# Altium schematic symbol library jlcpcb_2025_04_capacitors_extended_0603.schlib: 3668 symbols (part 5 of 20) (continued)
## 0603ZC104KAT2A
designator C?  Capacitance: 100nF  (hidden comment: *)
Capacitor, Ceramic (MLCC), 100nF, ±10%, 10V, X7R, ±10%, SMD 0603; Manufacturer: AVX; Manufacturer Part Number: 0603ZC104KAT2A; Package Size: 0603; JLCPCB Basic Part: No; JLCPCB Part Number: C597251; Supplier 1: LCSC; Category: Capacitors - MLCC; Supplier Part Number 1: C597251; Tolerance: ±10%; Voltage Rating: 10V; Temperature Coefficient: X7R; RoHS: Yes; ComponentLink1Description: Datasheet; ComponentLink1URL: https://wmsc.lcsc.com/wmsc/upload/file/pdf/v2/lcsc/2304140030_Kyocera-AVX-0603ZC104KAT2A_C597251.pdf; ComponentLink2Description: JLCPCB Part URL; ComponentLink2URL: https://jlcpcb.com/partdetail/C597251; ComponentLink3Description: LCSC Part URL; ComponentLink3URL: https://lcsc.com/product-detail/Multilayer-Ceramic-Capacitors-MLCC---SMD-SMT_Kyocera-AVX-Kyocera-AVX-0603ZC104KAT2A_C597251.html
footprint CAP-0603 (0603 (1608M) Capacitor)
pins: 1, 2

## 0603ZC105KAT2A
designator C?  Capacitance: 1uF  (hidden comment: *)
Capacitor, Ceramic (MLCC), 1uF, ±10%, 10V, X7R, ±10%, SMD 0603; Manufacturer: AVX; Manufacturer Part Number: 0603ZC105KAT2A; Package Size: 0603; JLCPCB Basic Part: No; JLCPCB Part Number: C597252; Supplier 1: LCSC; Category: Capacitors - MLCC; Supplier Part Number 1: C597252; Tolerance: ±10%; Voltage Rating: 10V; Temperature Coefficient: X7R; RoHS: Yes; ComponentLink1Description: Datasheet; ComponentLink1URL: https://wmsc.lcsc.com/wmsc/upload/file/pdf/v2/lcsc/2304140030_Kyocera-AVX-0603ZC105KAT2A_C597252.pdf; ComponentLink2Description: JLCPCB Part URL; ComponentLink2URL: https://jlcpcb.com/partdetail/C597252; ComponentLink3Description: LCSC Part URL; ComponentLink3URL: https://lcsc.com/product-detail/Multilayer-Ceramic-Capacitors-MLCC---SMD-SMT_Kyocera-AVX-Kyocera-AVX-0603ZC105KAT2A_C597252.html
footprint CAP-0603 (0603 (1608M) Capacitor)
pins: 1, 2

## 0603ZD104KAT2A
designator C?  Capacitance: 100nF  (hidden comment: *)
Capacitor, Ceramic (MLCC), 100nF, ±10%, 10V, X5R, ±10%, SMD 0603; Manufacturer: Kyocera AVX; Manufacturer Part Number: 0603ZD104KAT2A; Package Size: 0603; JLCPCB Basic Part: No; JLCPCB Part Number: C1856507; Supplier 1: LCSC; Category: Capacitors - MLCC; Supplier Part Number 1: C1856507; Tolerance: ±10%; Voltage Rating: 10V; Temperature Coefficient: X5R; RoHS: Yes; ComponentLink1Description: Datasheet; ComponentLink1URL: https://wmsc.lcsc.com/wmsc/upload/file/pdf/v2/lcsc/2304140030_Kyocera-AVX-0603ZD104KAT2A_C1856507.pdf; ComponentLink2Description: JLCPCB Part URL; ComponentLink2URL: https://jlcpcb.com/partdetail/C1856507; ComponentLink3Description: LCSC Part URL; ComponentLink3URL: https://lcsc.com/product-detail/Multilayer-Ceramic-Capacitors-MLCC---SMD-SMT_Kyocera-AVX-Kyocera-AVX-0603ZD104KAT2A_C1856507.html
footprint CAP-0603 (0603 (1608M) Capacitor)
pins: 1, 2

## 0603ZD105MAT2A
designator C?  Capacitance: 1uF  (hidden comment: *)
Capacitor, Ceramic (MLCC), 1uF, ±20%, 10V, X5R, ±20%, SMD 0603; Manufacturer: Kyocera AVX; Manufacturer Part Number: 0603ZD105MAT2A; Package Size: 0603; JLCPCB Basic Part: No; JLCPCB Part Number: C2173287; Supplier 1: LCSC; Category: Capacitors - MLCC; Supplier Part Number 1: C2173287; Tolerance: ±20%; Voltage Rating: 10V; Temperature Coefficient: X5R; RoHS: Yes; ComponentLink1Description: Datasheet; ComponentLink1URL: https://wmsc.lcsc.com/wmsc/upload/file/pdf/v2/lcsc/2304140030_Kyocera-AVX-0603ZD105MAT2A_C2173287.pdf; ComponentLink2Description: JLCPCB Part URL; ComponentLink2URL: https://jlcpcb.com/partdetail/C2173287; ComponentLink3Description: LCSC Part URL; ComponentLink3URL: https://lcsc.com/product-detail/Multilayer-Ceramic-Capacitors-MLCC---SMD-SMT_Kyocera-AVX-Kyocera-AVX-0603ZD105MAT2A_C2173287.html
footprint CAP-0603 (0603 (1608M) Capacitor)
pins: 1, 2

## 0603ZD475KAT2A
designator C?  Capacitance: 4.7uF  (hidden comment: *)
Capacitor, Ceramic (MLCC), 4.7uF, ±10%, 10V, X5R, ±10%, SMD 0603; Manufacturer: Kyocera AVX; Manufacturer Part Number: 0603ZD475KAT2A; Package Size: 0603; JLCPCB Basic Part: No; JLCPCB Part Number: C143643; Supplier 1: LCSC; Category: Capacitors - MLCC; Supplier Part Number 1: C143643; Tolerance: ±10%; Voltage Rating: 10V; Temperature Coefficient: X5R; RoHS: Yes; ComponentLink1Description: Datasheet; ComponentLink1URL: https://wmsc.lcsc.com/wmsc/upload/file/pdf/v2/lcsc/2212141909_Kyocera-AVX-0603ZD475KAT2A_C143643.pdf; ComponentLink2Description: JLCPCB Part URL; ComponentLink2URL: https://jlcpcb.com/partdetail/C143643; ComponentLink3Description: LCSC Part URL; ComponentLink3URL: https://lcsc.com/product-detail/Multilayer-Ceramic-Capacitors-MLCC---SMD-SMT_Kyocera-AVX-Kyocera-AVX-0603ZD475KAT2A_C143643.html
footprint CAP-0603 (0603 (1608M) Capacitor)
pins: 1, 2

## 0603ZG105ZAT2A
designator C?  Capacitance: 1uF  (hidden comment: *)
Capacitor, Ceramic (MLCC), 1uF, 10V, Y5V, SMD 0603; Manufacturer: AVX; Manufacturer Part Number: 0603ZG105ZAT2A; Temperature Rating: -20%~+80%; Package Size: 0603; JLCPCB Basic Part: No; JLCPCB Part Number: C597257; Supplier 1: LCSC; Category: Capacitors - MLCC; Supplier Part Number 1: C597257; Voltage Rating: 10V; Temperature Coefficient: Y5V; RoHS: Yes; ComponentLink1Description: Datasheet; ComponentLink1URL: https://wmsc.lcsc.com/wmsc/upload/file/pdf/v2/lcsc/2304140030_Kyocera-AVX-0603ZG105ZAT2A_C597257.pdf; ComponentLink2Description: JLCPCB Part URL; ComponentLink2URL: https://jlcpcb.com/partdetail/C597257; ComponentLink3Description: LCSC Part URL; ComponentLink3URL: https://lcsc.com/product-detail/Multilayer-Ceramic-Capacitors-MLCC---SMD-SMT_Kyocera-AVX-Kyocera-AVX-0603ZG105ZAT2A_C597257.html
footprint CAP-0603 (0603 (1608M) Capacitor)
pins: 1, 2

## 06031A100JAT2A
designator C?  Capacitance: 10pF  (hidden comment: *)
Capacitor, Ceramic (MLCC), 10pF, ±5%, 100V, C0G, ±5%, SMD 0603; Manufacturer: AVX; Manufacturer Part Number: 06031A100JAT2A; Package Size: 0603; JLCPCB Basic Part: No; JLCPCB Part Number: C513320; Supplier 1: LCSC; Category: Capacitors - MLCC; Supplier Part Number 1: C513320; Tolerance: ±5%; Voltage Rating: 100V; Temperature Coefficient: C0G; RoHS: Yes; ComponentLink1Description: Datasheet; ComponentLink1URL: https://wmsc.lcsc.com/wmsc/upload/file/pdf/v2/lcsc/2304140030_Kyocera-AVX-06031A100JAT2A_C513320.pdf; ComponentLink2Description: JLCPCB Part URL; ComponentLink2URL: https://jlcpcb.com/partdetail/C513320; ComponentLink3Description: LCSC Part URL; ComponentLink3URL: https://lcsc.com/product-detail/Multilayer-Ceramic-Capacitors-MLCC---SMD-SMT_Kyocera-AVX-Kyocera-AVX-06031A100JAT2A_C513320.html
footprint CAP-0603 (0603 (1608M) Capacitor)
pins: 1, 2

## 06031A101FAT2A
designator C?  Capacitance: 100pF  (hidden comment: *)
Capacitor, Ceramic (MLCC), 100pF, ±1%, 100V, C0G, ±1%, SMD 0603; Manufacturer: AVX; Manufacturer Part Number: 06031A101FAT2A; Package Size: 0603; JLCPCB Basic Part: No; JLCPCB Part Number: C597065; Supplier 1: LCSC; Category: Capacitors - MLCC; Supplier Part Number 1: C597065; Tolerance: ±1%; Voltage Rating: 100V; Temperature Coefficient: C0G; RoHS: Yes; ComponentLink1Description: Datasheet; ComponentLink1URL: https://wmsc.lcsc.com/wmsc/upload/file/pdf/v2/lcsc/2304140030_Kyocera-AVX-06031A101FAT2A_C597065.pdf; ComponentLink2Description: JLCPCB Part URL; ComponentLink2URL: https://jlcpcb.com/partdetail/C597065; ComponentLink3Description: LCSC Part URL; ComponentLink3URL: https://lcsc.com/product-detail/Multilayer-Ceramic-Capacitors-MLCC---SMD-SMT_Kyocera-AVX-Kyocera-AVX-06031A101FAT2A_C597065.html
footprint CAP-0603 (0603 (1608M) Capacitor)
pins: 1, 2

## 06031A101JAT2A
designator C?  Capacitance: 100pF  (hidden comment: *)
Capacitor, Ceramic (MLCC), 100pF, ±5%, 100V, C0G, ±5%, SMD 0603; Manufacturer: AVX; Manufacturer Part Number: 06031A101JAT2A; Package Size: 0603; JLCPCB Basic Part: No; JLCPCB Part Number: C513321; Supplier 1: LCSC; Category: Capacitors - MLCC; Supplier Part Number 1: C513321; Tolerance: ±5%; Voltage Rating: 100V; Temperature Coefficient: C0G; RoHS: Yes; ComponentLink1Description: Datasheet; ComponentLink1URL: https://wmsc.lcsc.com/wmsc/upload/file/pdf/v2/lcsc/2304140030_Kyocera-AVX-06031A101JAT2A_C513321.pdf; ComponentLink2Description: JLCPCB Part URL; ComponentLink2URL: https://jlcpcb.com/partdetail/C513321; ComponentLink3Description: LCSC Part URL; ComponentLink3URL: https://lcsc.com/product-detail/Multilayer-Ceramic-Capacitors-MLCC---SMD-SMT_Kyocera-AVX-Kyocera-AVX-06031A101JAT2A_C513321.html
footprint CAP-0603 (0603 (1608M) Capacitor)
pins: 1, 2

## 06031A150JAT2A
designator C?  Capacitance: 15pF  (hidden comment: *)
Capacitor, Ceramic (MLCC), 15pF, ±5%, 100V, C0G, ±5%, SMD 0603; Manufacturer: AVX; Manufacturer Part Number: 06031A150JAT2A; Package Size: 0603; JLCPCB Basic Part: No; JLCPCB Part Number: C597069; Supplier 1: LCSC; Category: Capacitors - MLCC; Supplier Part Number 1: C597069; Tolerance: ±5%; Voltage Rating: 100V; Temperature Coefficient: C0G; RoHS: Yes; ComponentLink1Description: Datasheet; ComponentLink1URL: https://wmsc.lcsc.com/wmsc/upload/file/pdf/v2/lcsc/2304140030_Kyocera-AVX-06031A150JAT2A_C597069.pdf; ComponentLink2Description: JLCPCB Part URL; ComponentLink2URL: https://jlcpcb.com/partdetail/C597069; ComponentLink3Description: LCSC Part URL; ComponentLink3URL: https://lcsc.com/product-detail/Multilayer-Ceramic-Capacitors-MLCC---SMD-SMT_Kyocera-AVX-Kyocera-AVX-06031A150JAT2A_C597069.html
footprint CAP-0603 (0603 (1608M) Capacitor)
pins: 1, 2

## 06031A180JAT2A
designator C?  Capacitance: 18pF  (hidden comment: *)
Capacitor, Ceramic (MLCC), 18pF, ±5%, 100V, C0G, ±5%, SMD 0603; Manufacturer: AVX; Manufacturer Part Number: 06031A180JAT2A; Package Size: 0603; JLCPCB Basic Part: No; JLCPCB Part Number: C597072; Supplier 1: LCSC; Category: Capacitors - MLCC; Supplier Part Number 1: C597072; Tolerance: ±5%; Voltage Rating: 100V; Temperature Coefficient: C0G; RoHS: Yes; ComponentLink1Description: Datasheet; ComponentLink1URL: https://wmsc.lcsc.com/wmsc/upload/file/pdf/v2/lcsc/2304140030_Kyocera-AVX-06031A180JAT2A_C597072.pdf; ComponentLink2Description: JLCPCB Part URL; ComponentLink2URL: https://jlcpcb.com/partdetail/C597072; ComponentLink3Description: LCSC Part URL; ComponentLink3URL: https://lcsc.com/product-detail/Multilayer-Ceramic-Capacitors-MLCC---SMD-SMT_Kyocera-AVX-Kyocera-AVX-06031A180JAT2A_C597072.html
footprint CAP-0603 (0603 (1608M) Capacitor)
pins: 1, 2

## 06031A220JAT2A
designator C?  Capacitance: 22pF  (hidden comment: *)
Capacitor, Ceramic (MLCC), 22pF, ±5%, 100V, C0G, ±5%, SMD 0603; Manufacturer: AVX; Manufacturer Part Number: 06031A220JAT2A; Package Size: 0603; JLCPCB Basic Part: No; JLCPCB Part Number: C597073; Supplier 1: LCSC; Category: Capacitors - MLCC; Supplier Part Number 1: C597073; Tolerance: ±5%; Voltage Rating: 100V; Temperature Coefficient: C0G; RoHS: Yes; ComponentLink1Description: Datasheet; ComponentLink1URL: https://wmsc.lcsc.com/wmsc/upload/file/pdf/v2/lcsc/2304140030_Kyocera-AVX-06031A220JAT2A_C597073.pdf; ComponentLink2Description: JLCPCB Part URL; ComponentLink2URL: https://jlcpcb.com/partdetail/C597073; ComponentLink3Description: LCSC Part URL; ComponentLink3URL: https://lcsc.com/product-detail/Multilayer-Ceramic-Capacitors-MLCC---SMD-SMT_Kyocera-AVX-Kyocera-AVX-06031A220JAT2A_C597073.html
footprint CAP-0603 (0603 (1608M) Capacitor)
pins: 1, 2

## 06031A270FAT2A
designator C?  Capacitance: 27pF  (hidden comment: *)
Capacitor, Ceramic (MLCC), 27pF, ±1%, 100V, C0G, ±1%, SMD 0603; Manufacturer: Kyocera AVX; Manufacturer Part Number: 06031A270FAT2A; Package Size: 0603; JLCPCB Basic Part: No; JLCPCB Part Number: C2170704; Supplier 1: LCSC; Category: Capacitors - MLCC; Supplier Part Number 1: C2170704; Tolerance: ±1%; Voltage Rating: 100V; Temperature Coefficient: C0G; RoHS: Yes; ComponentLink1Description: Datasheet; ComponentLink1URL: https://wmsc.lcsc.com/wmsc/upload/file/pdf/v2/lcsc/2304140030_Kyocera-AVX-06031A270FAT2A_C2170704.pdf; ComponentLink2Description: JLCPCB Part URL; ComponentLink2URL: https://jlcpcb.com/partdetail/C2170704; ComponentLink3Description: LCSC Part URL; ComponentLink3URL: https://lcsc.com/product-detail/Multilayer-Ceramic-Capacitors-MLCC---SMD-SMT_Kyocera-AVX-Kyocera-AVX-06031A270FAT2A_C2170704.html
footprint CAP-0603 (0603 (1608M) Capacitor)
pins: 1, 2

## 06031C102JAT2A
designator C?  Capacitance: 1nF  (hidden comment: *)
Capacitor, Ceramic (MLCC), 1nF, ±5%, 100V, X7R, ±5%, SMD 0603; Manufacturer: Kyocera AVX; Manufacturer Part Number: 06031C102JAT2A; Package Size: 0603; JLCPCB Basic Part: No; JLCPCB Part Number: C2179225; Supplier 1: LCSC; Category: Capacitors - MLCC; Supplier Part Number 1: C2179225; Tolerance: ±5%; Voltage Rating: 100V; Temperature Coefficient: X7R; RoHS: Yes; ComponentLink1Description: Datasheet; ComponentLink1URL: https://wmsc.lcsc.com/wmsc/upload/file/pdf/v2/lcsc/2304140030_Kyocera-AVX-06031C102JAT2A_C2179225.pdf; ComponentLink2Description: JLCPCB Part URL; ComponentLink2URL: https://jlcpcb.com/partdetail/C2179225; ComponentLink3Description: LCSC Part URL; ComponentLink3URL: https://lcsc.com/product-detail/Multilayer-Ceramic-Capacitors-MLCC---SMD-SMT_Kyocera-AVX-Kyocera-AVX-06031C102JAT2A_C2179225.html
footprint CAP-0603 (0603 (1608M) Capacitor)
pins: 1, 2

## 06031C102K4T2A
designator C?  Capacitance: 1nF  (hidden comment: *)
Capacitor, Ceramic (MLCC), 1nF, ±10%, 100V, X7R, ±10%, SMD 0603; Manufacturer: Kyocera AVX; Manufacturer Part Number: 06031C102K4T2A; Package Size: 0603; JLCPCB Basic Part: No; JLCPCB Part Number: C779978; Supplier 1: LCSC; Category: Capacitors - MLCC; Supplier Part Number 1: C779978; Tolerance: ±10%; Voltage Rating: 100V; Temperature Coefficient: X7R; RoHS: Yes; ComponentLink1Description: Datasheet; ComponentLink1URL: https://wmsc.lcsc.com/wmsc/upload/file/pdf/v2/lcsc/2304140030_Kyocera-AVX-06031C102K4T2A_C779978.pdf; ComponentLink2Description: JLCPCB Part URL; ComponentLink2URL: https://jlcpcb.com/partdetail/C779978; ComponentLink3Description: LCSC Part URL; ComponentLink3URL: https://lcsc.com/product-detail/Multilayer-Ceramic-Capacitors-MLCC---SMD-SMT_Kyocera-AVX-Kyocera-AVX-06031C102K4T2A_C779978.html
footprint CAP-0603 (0603 (1608M) Capacitor)
pins: 1, 2

## 06031C103K4T2A
designator C?  Capacitance: 10nF  (hidden comment: *)
Capacitor, Ceramic (MLCC), 10nF, ±10%, 100V, X7R, ±10%, SMD 0603; Manufacturer: AVX; Manufacturer Part Number: 06031C103K4T2A; Package Size: 0603; JLCPCB Basic Part: No; JLCPCB Part Number: C597087; Supplier 1: LCSC; Category: Capacitors - MLCC; Supplier Part Number 1: C597087; Tolerance: ±10%; Voltage Rating: 100V; Temperature Coefficient: X7R; RoHS: Yes; ComponentLink1Description: Datasheet; ComponentLink1URL: https://wmsc.lcsc.com/wmsc/upload/file/pdf/v2/lcsc/2304140030_Kyocera-AVX-06031C103K4T2A_C597087.pdf; ComponentLink2Description: JLCPCB Part URL; ComponentLink2URL: https://jlcpcb.com/partdetail/C597087; ComponentLink3Description: LCSC Part URL; ComponentLink3URL: https://lcsc.com/product-detail/Multilayer-Ceramic-Capacitors-MLCC---SMD-SMT_Kyocera-AVX-Kyocera-AVX-06031C103K4T2A_C597087.html
footprint CAP-0603 (0603 (1608M) Capacitor)
pins: 1, 2

## 06031C103K4Z2A
designator C?  Capacitance: 10nF  (hidden comment: *)
Capacitor, Ceramic (MLCC), 10nF, ±10%, 100V, X7R, ±10%, SMD 0603; Manufacturer: AVX; Manufacturer Part Number: 06031C103K4Z2A; Package Size: 0603; JLCPCB Basic Part: No; JLCPCB Part Number: C597088; Supplier 1: LCSC; Category: Capacitors - MLCC; Supplier Part Number 1: C597088; Tolerance: ±10%; Voltage Rating: 100V; Temperature Coefficient: X7R; RoHS: Yes; ComponentLink1Description: Datasheet; ComponentLink1URL: https://wmsc.lcsc.com/wmsc/upload/file/pdf/v2/lcsc/2304140030_Kyocera-AVX-06031C103K4Z2A_C597088.pdf; ComponentLink2Description: JLCPCB Part URL; ComponentLink2URL: https://jlcpcb.com/partdetail/C597088; ComponentLink3Description: LCSC Part URL; ComponentLink3URL: https://lcsc.com/product-detail/Multilayer-Ceramic-Capacitors-MLCC---SMD-SMT_Kyocera-AVX-Kyocera-AVX-06031C103K4Z2A_C597088.html
footprint CAP-0603 (0603 (1608M) Capacitor)
pins: 1, 2

## 06031C104K4T2A
designator C?  Capacitance: 100nF  (hidden comment: *)
Capacitor, Ceramic (MLCC), 100nF, ±10%, 100V, X7R, ±10%, SMD 0603; Manufacturer: Kyocera AVX; Manufacturer Part Number: 06031C104K4T2A; Package Size: 0603; JLCPCB Basic Part: No; JLCPCB Part Number: C1880996; Supplier 1: LCSC; Category: Capacitors - MLCC; Supplier Part Number 1: C1880996; Tolerance: ±10%; Voltage Rating: 100V; Temperature Coefficient: X7R; RoHS: Yes; ComponentLink1Description: Datasheet; ComponentLink1URL: https://wmsc.lcsc.com/wmsc/upload/file/pdf/v2/lcsc/2304140030_Kyocera-AVX-06031C104K4T2A_C1880996.pdf; ComponentLink2Description: JLCPCB Part URL; ComponentLink2URL: https://jlcpcb.com/partdetail/C1880996; ComponentLink3Description: LCSC Part URL; ComponentLink3URL: https://lcsc.com/product-detail/Multilayer-Ceramic-Capacitors-MLCC---SMD-SMT_Kyocera-AVX-Kyocera-AVX-06031C104K4T2A_C1880996.html
footprint CAP-0603 (0603 (1608M) Capacitor)
pins: 1, 2

## 06031C222KAT2A
designator C?  Capacitance: 2.2nF  (hidden comment: *)
Capacitor, Ceramic (MLCC), 2.2nF, ±10%, 100V, X7R, ±10%, SMD 0603; Manufacturer: AVX; Manufacturer Part Number: 06031C222KAT2A; Package Size: 0603; JLCPCB Basic Part: No; JLCPCB Part Number: C597093; Supplier 1: LCSC; Category: Capacitors - MLCC; Supplier Part Number 1: C597093; Tolerance: ±10%; Voltage Rating: 100V; Temperature Coefficient: X7R; RoHS: Yes; ComponentLink1Description: Datasheet; ComponentLink1URL: https://wmsc.lcsc.com/wmsc/upload/file/pdf/v2/lcsc/2304140030_Kyocera-AVX-06031C222KAT2A_C597093.pdf; ComponentLink2Description: JLCPCB Part URL; ComponentLink2URL: https://jlcpcb.com/partdetail/C597093; ComponentLink3Description: LCSC Part URL; ComponentLink3URL: https://lcsc.com/product-detail/Multilayer-Ceramic-Capacitors-MLCC---SMD-SMT_Kyocera-AVX-Kyocera-AVX-06031C222KAT2A_C597093.html
footprint CAP-0603 (0603 (1608M) Capacitor)
pins: 1, 2

## 06033A220JAT2A
designator C?  Capacitance: 22pF  (hidden comment: *)
Capacitor, Ceramic (MLCC), 22pF, ±5%, 25V, C0G, ±5%, SMD 0603; Manufacturer: Kyocera AVX; Manufacturer Part Number: 06033A220JAT2A; Package Size: 0603; JLCPCB Basic Part: No; JLCPCB Part Number: C2168907; Supplier 1: LCSC; Category: Capacitors - MLCC; Supplier Part Number 1: C2168907; Tolerance: ±5%; Voltage Rating: 25V; Temperature Coefficient: C0G; RoHS: Yes; ComponentLink1Description: Datasheet; ComponentLink1URL: https://wmsc.lcsc.com/wmsc/upload/file/pdf/v2/lcsc/2304140030_Kyocera-AVX-06033A220JAT2A_C2168907.pdf; ComponentLink2Description: JLCPCB Part URL; ComponentLink2URL: https://jlcpcb.com/partdetail/C2168907; ComponentLink3Description: LCSC Part URL; ComponentLink3URL: https://lcsc.com/product-detail/Multilayer-Ceramic-Capacitors-MLCC---SMD-SMT_Kyocera-AVX-Kyocera-AVX-06033A220JAT2A_C2168907.html
footprint CAP-0603 (0603 (1608M) Capacitor)
pins: 1, 2

## 06033A330JAT2A
designator C?  Capacitance: 33pF  (hidden comment: *)
Capacitor, Ceramic (MLCC), 33pF, ±5%, 25V, C0G, ±5%, SMD 0603; Manufacturer: Kyocera AVX; Manufacturer Part Number: 06033A330JAT2A; Package Size: 0603; JLCPCB Basic Part: No; JLCPCB Part Number: C1845626; Supplier 1: LCSC; Category: Capacitors - MLCC; Supplier Part Number 1: C1845626; Tolerance: ±5%; Voltage Rating: 25V; Temperature Coefficient: C0G; RoHS: Yes; ComponentLink1Description: Datasheet; ComponentLink2Description: JLCPCB Part URL; ComponentLink2URL: https://jlcpcb.com/partdetail/C1845626; ComponentLink3Description: LCSC Part URL; ComponentLink3URL: https://lcsc.com/product-detail/Multilayer-Ceramic-Capacitors-MLCC---SMD-SMT_Kyocera-AVX-Kyocera-AVX-06033A330JAT2A_C1845626.html
footprint CAP-0603 (0603 (1608M) Capacitor)
pins: 1, 2

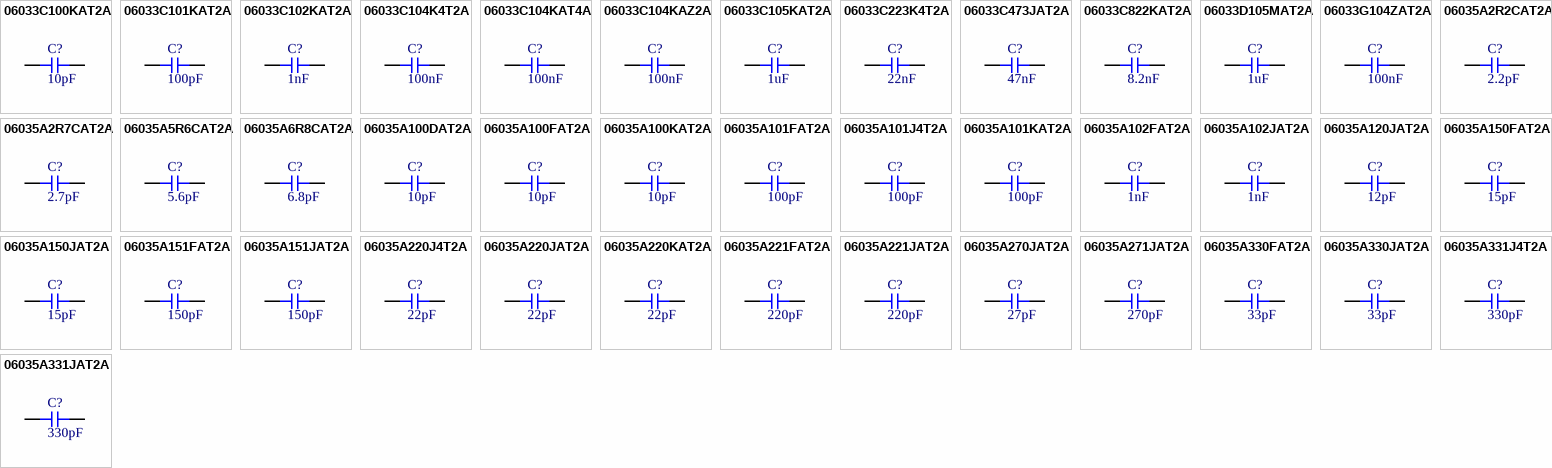
[diagram p22: symbols 06033C100KAT2A to 06035A331JAT2A]

## 06033C100KAT2A
designator C?  Capacitance: 10pF  (hidden comment: *)
Capacitor, Ceramic (MLCC), 10pF, ±10%, 25V, X7R, ±10%, SMD 0603; Manufacturer: Kyocera AVX; Manufacturer Part Number: 06033C100KAT2A; Package Size: 0603; JLCPCB Basic Part: No; JLCPCB Part Number: C2169522; Supplier 1: LCSC; Category: Capacitors - MLCC; Supplier Part Number 1: C2169522; Tolerance: ±10%; Voltage Rating: 25V; Temperature Coefficient: X7R; RoHS: Yes; ComponentLink1Description: Datasheet; ComponentLink1URL: https://wmsc.lcsc.com/wmsc/upload/file/pdf/v2/lcsc/2304140030_Kyocera-AVX-06033C100KAT2A_C2169522.pdf; ComponentLink2Description: JLCPCB Part URL; ComponentLink2URL: https://jlcpcb.com/partdetail/C2169522; ComponentLink3Description: LCSC Part URL; ComponentLink3URL: https://lcsc.com/product-detail/Multilayer-Ceramic-Capacitors-MLCC---SMD-SMT_Kyocera-AVX-Kyocera-AVX-06033C100KAT2A_C2169522.html
footprint CAP-0603 (0603 (1608M) Capacitor)
pins: 1, 2

## 06033C101KAT2A
designator C?  Capacitance: 100pF  (hidden comment: *)
Capacitor, Ceramic (MLCC), 100pF, ±10%, 25V, X7R, ±10%, SMD 0603; Manufacturer: Kyocera AVX; Manufacturer Part Number: 06033C101KAT2A; Package Size: 0603; JLCPCB Basic Part: No; JLCPCB Part Number: C2169660; Supplier 1: LCSC; Category: Capacitors - MLCC; Supplier Part Number 1: C2169660; Tolerance: ±10%; Voltage Rating: 25V; Temperature Coefficient: X7R; RoHS: Yes; ComponentLink1Description: Datasheet; ComponentLink1URL: https://wmsc.lcsc.com/wmsc/upload/file/pdf/v2/lcsc/2304140030_Kyocera-AVX-06033C101KAT2A_C2169660.pdf; ComponentLink2Description: JLCPCB Part URL; ComponentLink2URL: https://jlcpcb.com/partdetail/C2169660; ComponentLink3Description: LCSC Part URL; ComponentLink3URL: https://lcsc.com/product-detail/Multilayer-Ceramic-Capacitors-MLCC---SMD-SMT_Kyocera-AVX-Kyocera-AVX-06033C101KAT2A_C2169660.html
footprint CAP-0603 (0603 (1608M) Capacitor)
pins: 1, 2

## 06033C102KAT2A
designator C?  Capacitance: 1nF  (hidden comment: *)
Capacitor, Ceramic (MLCC), 1nF, ±10%, 25V, X7R, ±10%, SMD 0603; Manufacturer: Kyocera AVX; Manufacturer Part Number: 06033C102KAT2A; Package Size: 0603; JLCPCB Basic Part: No; JLCPCB Part Number: C2169750; Supplier 1: LCSC; Category: Capacitors - MLCC; Supplier Part Number 1: C2169750; Tolerance: ±10%; Voltage Rating: 25V; Temperature Coefficient: X7R; RoHS: Yes; ComponentLink1Description: Datasheet; ComponentLink1URL: https://wmsc.lcsc.com/wmsc/upload/file/pdf/v2/lcsc/2304140030_Kyocera-AVX-06033C102KAT2A_C2169750.pdf; ComponentLink2Description: JLCPCB Part URL; ComponentLink2URL: https://jlcpcb.com/partdetail/C2169750; ComponentLink3Description: LCSC Part URL; ComponentLink3URL: https://lcsc.com/product-detail/Multilayer-Ceramic-Capacitors-MLCC---SMD-SMT_Kyocera-AVX-Kyocera-AVX-06033C102KAT2A_C2169750.html
footprint CAP-0603 (0603 (1608M) Capacitor)
pins: 1, 2

## 06033C104K4T2A
designator C?  Capacitance: 100nF  (hidden comment: *)
Capacitor, Ceramic (MLCC), 100nF, ±10%, 25V, X7R, ±10%, SMD 0603; Manufacturer: AVX; Manufacturer Part Number: 06033C104K4T2A; Package Size: 0603; JLCPCB Basic Part: No; JLCPCB Part Number: C597114; Supplier 1: LCSC; Category: Capacitors - MLCC; Supplier Part Number 1: C597114; Tolerance: ±10%; Voltage Rating: 25V; Temperature Coefficient: X7R; RoHS: Yes; ComponentLink1Description: Datasheet; ComponentLink1URL: https://wmsc.lcsc.com/wmsc/upload/file/pdf/v2/lcsc/2304140030_Kyocera-AVX-06033C104K4T2A_C597114.pdf; ComponentLink2Description: JLCPCB Part URL; ComponentLink2URL: https://jlcpcb.com/partdetail/C597114; ComponentLink3Description: LCSC Part URL; ComponentLink3URL: https://lcsc.com/product-detail/Multilayer-Ceramic-Capacitors-MLCC---SMD-SMT_Kyocera-AVX-Kyocera-AVX-06033C104K4T2A_C597114.html
footprint CAP-0603 (0603 (1608M) Capacitor)
pins: 1, 2

## 06033C104KAT4A
designator C?  Capacitance: 100nF  (hidden comment: *)
Capacitor, Ceramic (MLCC), 100nF, ±10%, 25V, X7R, ±10%, SMD 0603; Manufacturer: AVX; Manufacturer Part Number: 06033C104KAT4A; Package Size: 0603; JLCPCB Basic Part: No; JLCPCB Part Number: C2167104; Supplier 1: LCSC; Category: Capacitors - MLCC; Supplier Part Number 1: C2167104; Tolerance: ±10%; Voltage Rating: 25V; Temperature Coefficient: X7R; RoHS: Yes; ComponentLink1Description: Datasheet; ComponentLink1URL: https://wmsc.lcsc.com/wmsc/upload/file/pdf/v2/lcsc/2304140030_Kyocera-AVX-06033C104KAT4A_C2167104.pdf; ComponentLink2Description: JLCPCB Part URL; ComponentLink2URL: https://jlcpcb.com/partdetail/C2167104; ComponentLink3Description: LCSC Part URL; ComponentLink3URL: https://lcsc.com/product-detail/Multilayer-Ceramic-Capacitors-MLCC---SMD-SMT_Kyocera-AVX-Kyocera-AVX-06033C104KAT4A_C2167104.html
footprint CAP-0603 (0603 (1608M) Capacitor)
pins: 1, 2

## 06033C104KAZ2A
designator C?  Capacitance: 100nF  (hidden comment: *)
Capacitor, Ceramic (MLCC), 100nF, ±10%, 25V, X7R, ±10%, SMD 0603; Manufacturer: Kyocera AVX; Manufacturer Part Number: 06033C104KAZ2A; Package Size: 0603; JLCPCB Basic Part: No; JLCPCB Part Number: C2167319; Supplier 1: LCSC; Category: Capacitors - MLCC; Supplier Part Number 1: C2167319; Tolerance: ±10%; Voltage Rating: 25V; Temperature Coefficient: X7R; RoHS: Yes; ComponentLink1Description: Datasheet; ComponentLink1URL: https://wmsc.lcsc.com/wmsc/upload/file/pdf/v2/lcsc/2304140030_Kyocera-AVX-06033C104KAZ2A_C2167319.pdf; ComponentLink2Description: JLCPCB Part URL; ComponentLink2URL: https://jlcpcb.com/partdetail/C2167319; ComponentLink3Description: LCSC Part URL; ComponentLink3URL: https://lcsc.com/product-detail/Multilayer-Ceramic-Capacitors-MLCC---SMD-SMT_Kyocera-AVX-Kyocera-AVX-06033C104KAZ2A_C2167319.html
footprint CAP-0603 (0603 (1608M) Capacitor)
pins: 1, 2

## 06033C105KAT2A
designator C?  Capacitance: 1uF  (hidden comment: *)
Capacitor, Ceramic (MLCC), 1uF, ±10%, 25V, X7R, ±10%, SMD 0603; Manufacturer: AVX; Manufacturer Part Number: 06033C105KAT2A; Package Size: 0603; JLCPCB Basic Part: No; JLCPCB Part Number: C597116; Supplier 1: LCSC; Category: Capacitors - MLCC; Supplier Part Number 1: C597116; Tolerance: ±10%; Voltage Rating: 25V; Temperature Coefficient: X7R; RoHS: Yes; ComponentLink1Description: Datasheet; ComponentLink1URL: https://wmsc.lcsc.com/wmsc/upload/file/pdf/v2/lcsc/2304140030_Kyocera-AVX-06033C105KAT2A_C597116.pdf; ComponentLink2Description: JLCPCB Part URL; ComponentLink2URL: https://jlcpcb.com/partdetail/C597116; ComponentLink3Description: LCSC Part URL; ComponentLink3URL: https://lcsc.com/product-detail/Multilayer-Ceramic-Capacitors-MLCC---SMD-SMT_Kyocera-AVX-Kyocera-AVX-06033C105KAT2A_C597116.html
footprint CAP-0603 (0603 (1608M) Capacitor)
pins: 1, 2

## 06033C223K4T2A
designator C?  Capacitance: 22nF  (hidden comment: *)
Capacitor, Ceramic (MLCC), 22nF, ±10%, 25V, X7R, ±10%, SMD 0603; Manufacturer: Kyocera AVX; Manufacturer Part Number: 06033C223K4T2A; Package Size: 0603; JLCPCB Basic Part: No; JLCPCB Part Number: C779971; Supplier 1: LCSC; Category: Capacitors - MLCC; Supplier Part Number 1: C779971; Tolerance: ±10%; Voltage Rating: 25V; Temperature Coefficient: X7R; RoHS: Yes; ComponentLink1Description: Datasheet; ComponentLink1URL: https://wmsc.lcsc.com/wmsc/upload/file/pdf/v2/lcsc/2304140030_Kyocera-AVX-06033C223K4T2A_C779971.pdf; ComponentLink2Description: JLCPCB Part URL; ComponentLink2URL: https://jlcpcb.com/partdetail/C779971; ComponentLink3Description: LCSC Part URL; ComponentLink3URL: https://lcsc.com/product-detail/Multilayer-Ceramic-Capacitors-MLCC---SMD-SMT_Kyocera-AVX-Kyocera-AVX-06033C223K4T2A_C779971.html
footprint CAP-0603 (0603 (1608M) Capacitor)
pins: 1, 2

## 06033C473JAT2A
designator C?  Capacitance: 47nF  (hidden comment: *)
Capacitor, Ceramic (MLCC), 47nF, ±5%, 25V, X7R, ±5%, SMD 0603; Manufacturer: AVX; Manufacturer Part Number: 06033C473JAT2A; Package Size: 0603; JLCPCB Basic Part: No; JLCPCB Part Number: C597122; Supplier 1: LCSC; Category: Capacitors - MLCC; Supplier Part Number 1: C597122; Tolerance: ±5%; Voltage Rating: 25V; Temperature Coefficient: X7R; RoHS: Yes; ComponentLink1Description: Datasheet; ComponentLink1URL: https://wmsc.lcsc.com/wmsc/upload/file/pdf/v2/lcsc/2304140030_Kyocera-AVX-06033C473JAT2A_C597122.pdf; ComponentLink2Description: JLCPCB Part URL; ComponentLink2URL: https://jlcpcb.com/partdetail/C597122; ComponentLink3Description: LCSC Part URL; ComponentLink3URL: https://lcsc.com/product-detail/Multilayer-Ceramic-Capacitors-MLCC---SMD-SMT_Kyocera-AVX-Kyocera-AVX-06033C473JAT2A_C597122.html
footprint CAP-0603 (0603 (1608M) Capacitor)
pins: 1, 2

## 06033C822KAT2A
designator C?  Capacitance: 8.2nF  (hidden comment: *)
Capacitor, Ceramic (MLCC), 8.2nF, ±10%, 25V, X7R, ±10%, SMD 0603; Manufacturer: Kyocera AVX; Manufacturer Part Number: 06033C822KAT2A; Package Size: 0603; JLCPCB Basic Part: No; JLCPCB Part Number: C1856442; Supplier 1: LCSC; Category: Capacitors - MLCC; Supplier Part Number 1: C1856442; Tolerance: ±10%; Voltage Rating: 25V; Temperature Coefficient: X7R; RoHS: Yes; ComponentLink1Description: Datasheet; ComponentLink1URL: https://wmsc.lcsc.com/wmsc/upload/file/pdf/v2/lcsc/2205161616_Kyocera-AVX-06033C822KAT2A_C1856442.pdf; ComponentLink2Description: JLCPCB Part URL; ComponentLink2URL: https://jlcpcb.com/partdetail/C1856442; ComponentLink3Description: LCSC Part URL; ComponentLink3URL: https://lcsc.com/product-detail/Multilayer-Ceramic-Capacitors-MLCC---SMD-SMT_Kyocera-AVX-Kyocera-AVX-06033C822KAT2A_C1856442.html
footprint CAP-0603 (0603 (1608M) Capacitor)
pins: 1, 2

## 06033D105MAT2A
designator C?  Capacitance: 1uF  (hidden comment: *)
Capacitor, Ceramic (MLCC), 1uF, ±20%, 25V, X5R, ±20%, SMD 0603; Manufacturer: AVX; Manufacturer Part Number: 06033D105MAT2A; Package Size: 0603; JLCPCB Basic Part: No; JLCPCB Part Number: C597124; Supplier 1: LCSC; Category: Capacitors - MLCC; Supplier Part Number 1: C597124; Tolerance: ±20%; Voltage Rating: 25V; Temperature Coefficient: X5R; RoHS: Yes; ComponentLink1Description: Datasheet; ComponentLink1URL: https://wmsc.lcsc.com/wmsc/upload/file/pdf/v2/lcsc/2304140030_Kyocera-AVX-06033D105MAT2A_C597124.pdf; ComponentLink2Description: JLCPCB Part URL; ComponentLink2URL: https://jlcpcb.com/partdetail/C597124; ComponentLink3Description: LCSC Part URL; ComponentLink3URL: https://lcsc.com/product-detail/Multilayer-Ceramic-Capacitors-MLCC---SMD-SMT_Kyocera-AVX-Kyocera-AVX-06033D105MAT2A_C597124.html
footprint CAP-0603 (0603 (1608M) Capacitor)
pins: 1, 2

## 06033G104ZAT2A
designator C?  Capacitance: 100nF  (hidden comment: *)
Capacitor, Ceramic (MLCC), 100nF, 25V, Y5V, SMD 0603; Manufacturer: Kyocera AVX; Manufacturer Part Number: 06033G104ZAT2A; Temperature Rating: -20%~+80%; Package Size: 0603; JLCPCB Basic Part: No; JLCPCB Part Number: C2168704; Supplier 1: LCSC; Category: Capacitors - MLCC; Supplier Part Number 1: C2168704; Voltage Rating: 25V; Temperature Coefficient: Y5V; RoHS: Yes; ComponentLink1Description: Datasheet; ComponentLink1URL: https://wmsc.lcsc.com/wmsc/upload/file/pdf/v2/lcsc/2304140030_Kyocera-AVX-06033G104ZAT2A_C2168704.pdf; ComponentLink2Description: JLCPCB Part URL; ComponentLink2URL: https://jlcpcb.com/partdetail/C2168704; ComponentLink3Description: LCSC Part URL; ComponentLink3URL: https://lcsc.com/product-detail/Multilayer-Ceramic-Capacitors-MLCC---SMD-SMT_Kyocera-AVX-Kyocera-AVX-06033G104ZAT2A_C2168704.html
footprint CAP-0603 (0603 (1608M) Capacitor)
pins: 1, 2

## 06035A2R2CAT2A
designator C?  Capacitance: 2.2pF  (hidden comment: *)
Capacitor, Ceramic (MLCC), 2.2pF, 50V, C0G, SMD 0603; Manufacturer: Kyocera AVX; Manufacturer Part Number: 06035A2R2CAT2A; Package Size: 0603; JLCPCB Basic Part: No; JLCPCB Part Number: C2169656; Supplier 1: LCSC; Category: Capacitors - MLCC; Supplier Part Number 1: C2169656; Voltage Rating: 50V; Temperature Coefficient: C0G; RoHS: Yes; ComponentLink1Description: Datasheet; ComponentLink1URL: https://wmsc.lcsc.com/wmsc/upload/file/pdf/v2/lcsc/2304140030_Kyocera-AVX-06035A2R2CAT2A_C2169656.pdf; ComponentLink2Description: JLCPCB Part URL; ComponentLink2URL: https://jlcpcb.com/partdetail/C2169656; ComponentLink3Description: LCSC Part URL; ComponentLink3URL: https://lcsc.com/product-detail/Multilayer-Ceramic-Capacitors-MLCC---SMD-SMT_Kyocera-AVX-Kyocera-AVX-06035A2R2CAT2A_C2169656.html
footprint CAP-0603 (0603 (1608M) Capacitor)
pins: 1, 2

## 06035A2R7CAT2A
designator C?  Capacitance: 2.7pF  (hidden comment: *)
Capacitor, Ceramic (MLCC), 2.7pF, 50V, C0G, SMD 0603; Manufacturer: AVX; Manufacturer Part Number: 06035A2R7CAT2A; Package Size: 0603; JLCPCB Basic Part: No; JLCPCB Part Number: C597157; Supplier 1: LCSC; Category: Capacitors - MLCC; Supplier Part Number 1: C597157; Voltage Rating: 50V; Temperature Coefficient: C0G; RoHS: Yes; ComponentLink1Description: Datasheet; ComponentLink1URL: https://wmsc.lcsc.com/wmsc/upload/file/pdf/v2/lcsc/2304140030_Kyocera-AVX-06035A2R7CAT2A_C597157.pdf; ComponentLink2Description: JLCPCB Part URL; ComponentLink2URL: https://jlcpcb.com/partdetail/C597157; ComponentLink3Description: LCSC Part URL; ComponentLink3URL: https://lcsc.com/product-detail/Multilayer-Ceramic-Capacitors-MLCC---SMD-SMT_Kyocera-AVX-Kyocera-AVX-06035A2R7CAT2A_C597157.html
footprint CAP-0603 (0603 (1608M) Capacitor)
pins: 1, 2

## 06035A5R6CAT2A
designator C?  Capacitance: 5.6pF  (hidden comment: *)
Capacitor, Ceramic (MLCC), 5.6pF, null, null, SMD 0603; Manufacturer: Kyocera AVX; Manufacturer Part Number: 06035A5R6CAT2A; Package Size: 0603; JLCPCB Basic Part: No; JLCPCB Part Number: C3013492; Supplier 1: LCSC; Category: Capacitors - MLCC; Supplier Part Number 1: C3013492; Voltage Rating: null; Temperature Coefficient: null; RoHS: Yes; ComponentLink1Description: Datasheet; ComponentLink1URL: https://wmsc.lcsc.com/wmsc/upload/file/pdf/v2/lcsc/2206302045_Kyocera-AVX-06035A5R6CAT2A_C3013492.pdf; ComponentLink2Description: JLCPCB Part URL; ComponentLink2URL: https://jlcpcb.com/partdetail/C3013492; ComponentLink3Description: LCSC Part URL; ComponentLink3URL: https://lcsc.com/product-detail/Multilayer-Ceramic-Capacitors-MLCC---SMD-SMT_Kyocera-AVX-Kyocera-AVX-06035A5R6CAT2A_C3013492.html
footprint CAP-0603 (0603 (1608M) Capacitor)
pins: 1, 2

## 06035A6R8CAT2A
designator C?  Capacitance: 6.8pF  (hidden comment: *)
Capacitor, Ceramic (MLCC), 6.8pF, 50V, C0G, SMD 0603; Manufacturer: AVX; Manufacturer Part Number: 06035A6R8CAT2A; Package Size: 0603; JLCPCB Basic Part: No; JLCPCB Part Number: C597176; Supplier 1: LCSC; Category: Capacitors - MLCC; Supplier Part Number 1: C597176; Voltage Rating: 50V; Temperature Coefficient: C0G; RoHS: Yes; ComponentLink1Description: Datasheet; ComponentLink1URL: https://wmsc.lcsc.com/wmsc/upload/file/pdf/v2/lcsc/2304140030_Kyocera-AVX-06035A6R8CAT2A_C597176.pdf; ComponentLink2Description: JLCPCB Part URL; ComponentLink2URL: https://jlcpcb.com/partdetail/C597176; ComponentLink3Description: LCSC Part URL; ComponentLink3URL: https://lcsc.com/product-detail/Multilayer-Ceramic-Capacitors-MLCC---SMD-SMT_Kyocera-AVX-Kyocera-AVX-06035A6R8CAT2A_C597176.html
footprint CAP-0603 (0603 (1608M) Capacitor)
pins: 1, 2

## 06035A100DAT2A
designator C?  Capacitance: 10pF  (hidden comment: *)
Capacitor, Ceramic (MLCC), 10pF, 50V, C0G, SMD 0603; Manufacturer: AVX; Manufacturer Part Number: 06035A100DAT2A; Package Size: 0603; JLCPCB Basic Part: No; JLCPCB Part Number: C597127; Supplier 1: LCSC; Category: Capacitors - MLCC; Supplier Part Number 1: C597127; Voltage Rating: 50V; Temperature Coefficient: C0G; RoHS: Yes; ComponentLink1Description: Datasheet; ComponentLink1URL: https://wmsc.lcsc.com/wmsc/upload/file/pdf/v2/lcsc/2304140030_Kyocera-AVX-06035A100DAT2A_C597127.pdf; ComponentLink2Description: JLCPCB Part URL; ComponentLink2URL: https://jlcpcb.com/partdetail/C597127; ComponentLink3Description: LCSC Part URL; ComponentLink3URL: https://lcsc.com/product-detail/Multilayer-Ceramic-Capacitors-MLCC---SMD-SMT_Kyocera-AVX-Kyocera-AVX-06035A100DAT2A_C597127.html
footprint CAP-0603 (0603 (1608M) Capacitor)
pins: 1, 2

## 06035A100FAT2A
designator C?  Capacitance: 10pF  (hidden comment: *)
Capacitor, Ceramic (MLCC), 10pF, ±1%, 50V, C0G, ±1%, SMD 0603; Manufacturer: AVX; Manufacturer Part Number: 06035A100FAT2A; Package Size: 0603; JLCPCB Basic Part: No; JLCPCB Part Number: C597128; Supplier 1: LCSC; Category: Capacitors - MLCC; Supplier Part Number 1: C597128; Tolerance: ±1%; Voltage Rating: 50V; Temperature Coefficient: C0G; RoHS: Yes; ComponentLink1Description: Datasheet; ComponentLink1URL: https://wmsc.lcsc.com/wmsc/upload/file/pdf/v2/lcsc/2304140030_Kyocera-AVX-06035A100FAT2A_C597128.pdf; ComponentLink2Description: JLCPCB Part URL; ComponentLink2URL: https://jlcpcb.com/partdetail/C597128; ComponentLink3Description: LCSC Part URL; ComponentLink3URL: https://lcsc.com/product-detail/Multilayer-Ceramic-Capacitors-MLCC---SMD-SMT_Kyocera-AVX-Kyocera-AVX-06035A100FAT2A_C597128.html
footprint CAP-0603 (0603 (1608M) Capacitor)
pins: 1, 2

## 06035A100KAT2A
designator C?  Capacitance: 10pF  (hidden comment: *)
Capacitor, Ceramic (MLCC), 10pF, ±10%, 50V, C0G, ±10%, SMD 0603; Manufacturer: AVX; Manufacturer Part Number: 06035A100KAT2A; Package Size: 0603; JLCPCB Basic Part: No; JLCPCB Part Number: C597129; Supplier 1: LCSC; Category: Capacitors - MLCC; Supplier Part Number 1: C597129; Tolerance: ±10%; Voltage Rating: 50V; Temperature Coefficient: C0G; RoHS: Yes; ComponentLink1Description: Datasheet; ComponentLink1URL: https://wmsc.lcsc.com/wmsc/upload/file/pdf/v2/lcsc/2304140030_Kyocera-AVX-06035A100KAT2A_C597129.pdf; ComponentLink2Description: JLCPCB Part URL; ComponentLink2URL: https://jlcpcb.com/partdetail/C597129; ComponentLink3Description: LCSC Part URL; ComponentLink3URL: https://lcsc.com/product-detail/Multilayer-Ceramic-Capacitors-MLCC---SMD-SMT_Kyocera-AVX-Kyocera-AVX-06035A100KAT2A_C597129.html
footprint CAP-0603 (0603 (1608M) Capacitor)
pins: 1, 2

## 06035A101FAT2A
designator C?  Capacitance: 100pF  (hidden comment: *)
Capacitor, Ceramic (MLCC), 100pF, ±1%, 50V, C0G, ±1%, SMD 0603; Manufacturer: AVX; Manufacturer Part Number: 06035A101FAT2A; Package Size: 0603; JLCPCB Basic Part: No; JLCPCB Part Number: C597130; Supplier 1: LCSC; Category: Capacitors - MLCC; Supplier Part Number 1: C597130; Tolerance: ±1%; Voltage Rating: 50V; Temperature Coefficient: C0G; RoHS: Yes; ComponentLink1Description: Datasheet; ComponentLink1URL: https://wmsc.lcsc.com/wmsc/upload/file/pdf/v2/lcsc/2304140030_Kyocera-AVX-06035A101FAT2A_C597130.pdf; ComponentLink2Description: JLCPCB Part URL; ComponentLink2URL: https://jlcpcb.com/partdetail/C597130; ComponentLink3Description: LCSC Part URL; ComponentLink3URL: https://lcsc.com/product-detail/Multilayer-Ceramic-Capacitors-MLCC---SMD-SMT_Kyocera-AVX-Kyocera-AVX-06035A101FAT2A_C597130.html
footprint CAP-0603 (0603 (1608M) Capacitor)
pins: 1, 2

## 06035A101J4T2A
designator C?  Capacitance: 100pF  (hidden comment: *)
Capacitor, Ceramic (MLCC), 100pF, ±5%, 50V, C0G, ±5%, SMD 0603; Manufacturer: AVX; Manufacturer Part Number: 06035A101J4T2A; Package Size: 0603; JLCPCB Basic Part: No; JLCPCB Part Number: C597131; Supplier 1: LCSC; Category: Capacitors - MLCC; Supplier Part Number 1: C597131; Tolerance: ±5%; Voltage Rating: 50V; Temperature Coefficient: C0G; RoHS: Yes; ComponentLink1Description: Datasheet; ComponentLink1URL: https://wmsc.lcsc.com/wmsc/upload/file/pdf/v2/lcsc/2304140030_Kyocera-AVX-06035A101J4T2A_C597131.pdf; ComponentLink2Description: JLCPCB Part URL; ComponentLink2URL: https://jlcpcb.com/partdetail/C597131; ComponentLink3Description: LCSC Part URL; ComponentLink3URL: https://lcsc.com/product-detail/Multilayer-Ceramic-Capacitors-MLCC---SMD-SMT_Kyocera-AVX-Kyocera-AVX-06035A101J4T2A_C597131.html
footprint CAP-0603 (0603 (1608M) Capacitor)
pins: 1, 2

## 06035A101KAT2A
designator C?  Capacitance: 100pF  (hidden comment: *)
Capacitor, Ceramic (MLCC), 100pF, ±10%, 50V, C0G, ±10%, SMD 0603; Manufacturer: AVX; Manufacturer Part Number: 06035A101KAT2A; Package Size: 0603; JLCPCB Basic Part: No; JLCPCB Part Number: C597132; Supplier 1: LCSC; Category: Capacitors - MLCC; Supplier Part Number 1: C597132; Tolerance: ±10%; Voltage Rating: 50V; Temperature Coefficient: C0G; RoHS: Yes; ComponentLink1Description: Datasheet; ComponentLink1URL: https://wmsc.lcsc.com/wmsc/upload/file/pdf/v2/lcsc/2304140030_Kyocera-AVX-06035A101KAT2A_C597132.pdf; ComponentLink2Description: JLCPCB Part URL; ComponentLink2URL: https://jlcpcb.com/partdetail/C597132; ComponentLink3Description: LCSC Part URL; ComponentLink3URL: https://lcsc.com/product-detail/Multilayer-Ceramic-Capacitors-MLCC---SMD-SMT_Kyocera-AVX-Kyocera-AVX-06035A101KAT2A_C597132.html
footprint CAP-0603 (0603 (1608M) Capacitor)
pins: 1, 2

## 06035A102FAT2A
designator C?  Capacitance: 1nF  (hidden comment: *)
Capacitor, Ceramic (MLCC), 1nF, ±1%, 50V, C0G, ±1%, SMD 0603; Manufacturer: Kyocera AVX; Manufacturer Part Number: 06035A102FAT2A; Package Size: 0603; JLCPCB Basic Part: No; JLCPCB Part Number: C2167453; Supplier 1: LCSC; Category: Capacitors - MLCC; Supplier Part Number 1: C2167453; Tolerance: ±1%; Voltage Rating: 50V; Temperature Coefficient: C0G; RoHS: Yes; ComponentLink1Description: Datasheet; ComponentLink1URL: https://wmsc.lcsc.com/wmsc/upload/file/pdf/v2/lcsc/2304140030_Kyocera-AVX-06035A102FAT2A_C2167453.pdf; ComponentLink2Description: JLCPCB Part URL; ComponentLink2URL: https://jlcpcb.com/partdetail/C2167453; ComponentLink3Description: LCSC Part URL; ComponentLink3URL: https://lcsc.com/product-detail/Multilayer-Ceramic-Capacitors-MLCC---SMD-SMT_Kyocera-AVX-Kyocera-AVX-06035A102FAT2A_C2167453.html
footprint CAP-0603 (0603 (1608M) Capacitor)
pins: 1, 2

## 06035A102JAT2A
designator C?  Capacitance: 1nF  (hidden comment: *)
Capacitor, Ceramic (MLCC), 1nF, ±5%, 50V, C0G, ±5%, SMD 0603; Manufacturer: Kyocera AVX; Manufacturer Part Number: 06035A102JAT2A; Package Size: 0603; JLCPCB Basic Part: No; JLCPCB Part Number: C2167082; Supplier 1: LCSC; Category: Capacitors - MLCC; Supplier Part Number 1: C2167082; Tolerance: ±5%; Voltage Rating: 50V; Temperature Coefficient: C0G; RoHS: Yes; ComponentLink1Description: Datasheet; ComponentLink1URL: https://wmsc.lcsc.com/wmsc/upload/file/pdf/v2/lcsc/2304140030_Kyocera-AVX-06035A102JAT2A_C2167082.pdf; ComponentLink2Description: JLCPCB Part URL; ComponentLink2URL: https://jlcpcb.com/partdetail/C2167082; ComponentLink3Description: LCSC Part URL; ComponentLink3URL: https://lcsc.com/product-detail/Multilayer-Ceramic-Capacitors-MLCC---SMD-SMT_Kyocera-AVX-Kyocera-AVX-06035A102JAT2A_C2167082.html
footprint CAP-0603 (0603 (1608M) Capacitor)
pins: 1, 2

## 06035A120JAT2A
designator C?  Capacitance: 12pF  (hidden comment: *)
Capacitor, Ceramic (MLCC), 12pF, ±5%, 50V, C0G, ±5%, SMD 0603; Manufacturer: AVX; Manufacturer Part Number: 06035A120JAT2A; Package Size: 0603; JLCPCB Basic Part: No; JLCPCB Part Number: C513323; Supplier 1: LCSC; Category: Capacitors - MLCC; Supplier Part Number 1: C513323; Tolerance: ±5%; Voltage Rating: 50V; Temperature Coefficient: C0G; RoHS: Yes; ComponentLink1Description: Datasheet; ComponentLink1URL: https://wmsc.lcsc.com/wmsc/upload/file/pdf/v2/lcsc/2304140030_Kyocera-AVX-06035A120JAT2A_C513323.pdf; ComponentLink2Description: JLCPCB Part URL; ComponentLink2URL: https://jlcpcb.com/partdetail/C513323; ComponentLink3Description: LCSC Part URL; ComponentLink3URL: https://lcsc.com/product-detail/Multilayer-Ceramic-Capacitors-MLCC---SMD-SMT_Kyocera-AVX-Kyocera-AVX-06035A120JAT2A_C513323.html
footprint CAP-0603 (0603 (1608M) Capacitor)
pins: 1, 2

## 06035A150FAT2A
designator C?  Capacitance: 15pF  (hidden comment: *)
Capacitor, Ceramic (MLCC), 15pF, ±1%, 50V, C0G, ±1%, SMD 0603; Manufacturer: Kyocera AVX; Manufacturer Part Number: 06035A150FAT2A; Package Size: 0603; JLCPCB Basic Part: No; JLCPCB Part Number: C2169302; Supplier 1: LCSC; Category: Capacitors - MLCC; Supplier Part Number 1: C2169302; Tolerance: ±1%; Voltage Rating: 50V; Temperature Coefficient: C0G; RoHS: Yes; ComponentLink1Description: Datasheet; ComponentLink1URL: https://wmsc.lcsc.com/wmsc/upload/file/pdf/v2/lcsc/2304140030_Kyocera-AVX-06035A150FAT2A_C2169302.pdf; ComponentLink2Description: JLCPCB Part URL; ComponentLink2URL: https://jlcpcb.com/partdetail/C2169302; ComponentLink3Description: LCSC Part URL; ComponentLink3URL: https://lcsc.com/product-detail/Multilayer-Ceramic-Capacitors-MLCC---SMD-SMT_Kyocera-AVX-Kyocera-AVX-06035A150FAT2A_C2169302.html
footprint CAP-0603 (0603 (1608M) Capacitor)
pins: 1, 2

## 06035A150JAT2A
designator C?  Capacitance: 15pF  (hidden comment: *)
Capacitor, Ceramic (MLCC), 15pF, ±5%, 50V, C0G, ±5%, SMD 0603; Manufacturer: AVX; Manufacturer Part Number: 06035A150JAT2A; Package Size: 0603; JLCPCB Basic Part: No; JLCPCB Part Number: C597137; Supplier 1: LCSC; Category: Capacitors - MLCC; Supplier Part Number 1: C597137; Tolerance: ±5%; Voltage Rating: 50V; Temperature Coefficient: C0G; RoHS: Yes; ComponentLink1Description: Datasheet; ComponentLink1URL: https://wmsc.lcsc.com/wmsc/upload/file/pdf/v2/lcsc/2304140030_Kyocera-AVX-06035A150JAT2A_C597137.pdf; ComponentLink2Description: JLCPCB Part URL; ComponentLink2URL: https://jlcpcb.com/partdetail/C597137; ComponentLink3Description: LCSC Part URL; ComponentLink3URL: https://lcsc.com/product-detail/Multilayer-Ceramic-Capacitors-MLCC---SMD-SMT_Kyocera-AVX-Kyocera-AVX-06035A150JAT2A_C597137.html
footprint CAP-0603 (0603 (1608M) Capacitor)
pins: 1, 2

## 06035A151FAT2A
designator C?  Capacitance: 150pF  (hidden comment: *)
Capacitor, Ceramic (MLCC), 150pF, ±1%, 50V, C0G, ±1%, SMD 0603; Manufacturer: AVX; Manufacturer Part Number: 06035A151FAT2A; Package Size: 0603; JLCPCB Basic Part: No; JLCPCB Part Number: C597138; Supplier 1: LCSC; Category: Capacitors - MLCC; Supplier Part Number 1: C597138; Tolerance: ±1%; Voltage Rating: 50V; Temperature Coefficient: C0G; RoHS: Yes; ComponentLink1Description: Datasheet; ComponentLink1URL: https://wmsc.lcsc.com/wmsc/upload/file/pdf/v2/lcsc/2304140030_Kyocera-AVX-06035A151FAT2A_C597138.pdf; ComponentLink2Description: JLCPCB Part URL; ComponentLink2URL: https://jlcpcb.com/partdetail/C597138; ComponentLink3Description: LCSC Part URL; ComponentLink3URL: https://lcsc.com/product-detail/Multilayer-Ceramic-Capacitors-MLCC---SMD-SMT_Kyocera-AVX-Kyocera-AVX-06035A151FAT2A_C597138.html
footprint CAP-0603 (0603 (1608M) Capacitor)
pins: 1, 2

## 06035A151JAT2A
designator C?  Capacitance: 150pF  (hidden comment: *)
Capacitor, Ceramic (MLCC), 150pF, ±5%, 50V, C0G, ±5%, SMD 0603; Manufacturer: AVX; Manufacturer Part Number: 06035A151JAT2A; Package Size: 0603; JLCPCB Basic Part: No; JLCPCB Part Number: C597140; Supplier 1: LCSC; Category: Capacitors - MLCC; Supplier Part Number 1: C597140; Tolerance: ±5%; Voltage Rating: 50V; Temperature Coefficient: C0G; RoHS: Yes; ComponentLink1Description: Datasheet; ComponentLink1URL: https://wmsc.lcsc.com/wmsc/upload/file/pdf/v2/lcsc/2304140030_Kyocera-AVX-06035A151JAT2A_C597140.pdf; ComponentLink2Description: JLCPCB Part URL; ComponentLink2URL: https://jlcpcb.com/partdetail/C597140; ComponentLink3Description: LCSC Part URL; ComponentLink3URL: https://lcsc.com/product-detail/Multilayer-Ceramic-Capacitors-MLCC---SMD-SMT_Kyocera-AVX-Kyocera-AVX-06035A151JAT2A_C597140.html
footprint CAP-0603 (0603 (1608M) Capacitor)
pins: 1, 2

## 06035A220J4T2A
designator C?  Capacitance: 22pF  (hidden comment: *)
Capacitor, Ceramic (MLCC), 22pF, ±5%, 50V, C0G, ±5%, SMD 0603; Manufacturer: Kyocera AVX; Manufacturer Part Number: 06035A220J4T2A; Package Size: 0603; JLCPCB Basic Part: No; JLCPCB Part Number: C2169678; Supplier 1: LCSC; Category: Capacitors - MLCC; Supplier Part Number 1: C2169678; Tolerance: ±5%; Voltage Rating: 50V; Temperature Coefficient: C0G; RoHS: Yes; ComponentLink1Description: Datasheet; ComponentLink1URL: https://wmsc.lcsc.com/wmsc/upload/file/pdf/v2/lcsc/2304140030_Kyocera-AVX-06035A220J4T2A_C2169678.pdf; ComponentLink2Description: JLCPCB Part URL; ComponentLink2URL: https://jlcpcb.com/partdetail/C2169678; ComponentLink3Description: LCSC Part URL; ComponentLink3URL: https://lcsc.com/product-detail/Multilayer-Ceramic-Capacitors-MLCC---SMD-SMT_Kyocera-AVX-Kyocera-AVX-06035A220J4T2A_C2169678.html
footprint CAP-0603 (0603 (1608M) Capacitor)
pins: 1, 2